# Altium footprint library 687 1xx 140 22.PcbLib: 24 footprints (part 2 of 2)
Each footprint in its own frame and in the unit in brackets; x right, y up, seen from the top. Pads: shape width x height; smd on the part's side, far side on the other; paste and mask are expansions set on the pad; w line width, h text height; cw(c..) or ccw(c..) is an arc to the next point about the centre after c.
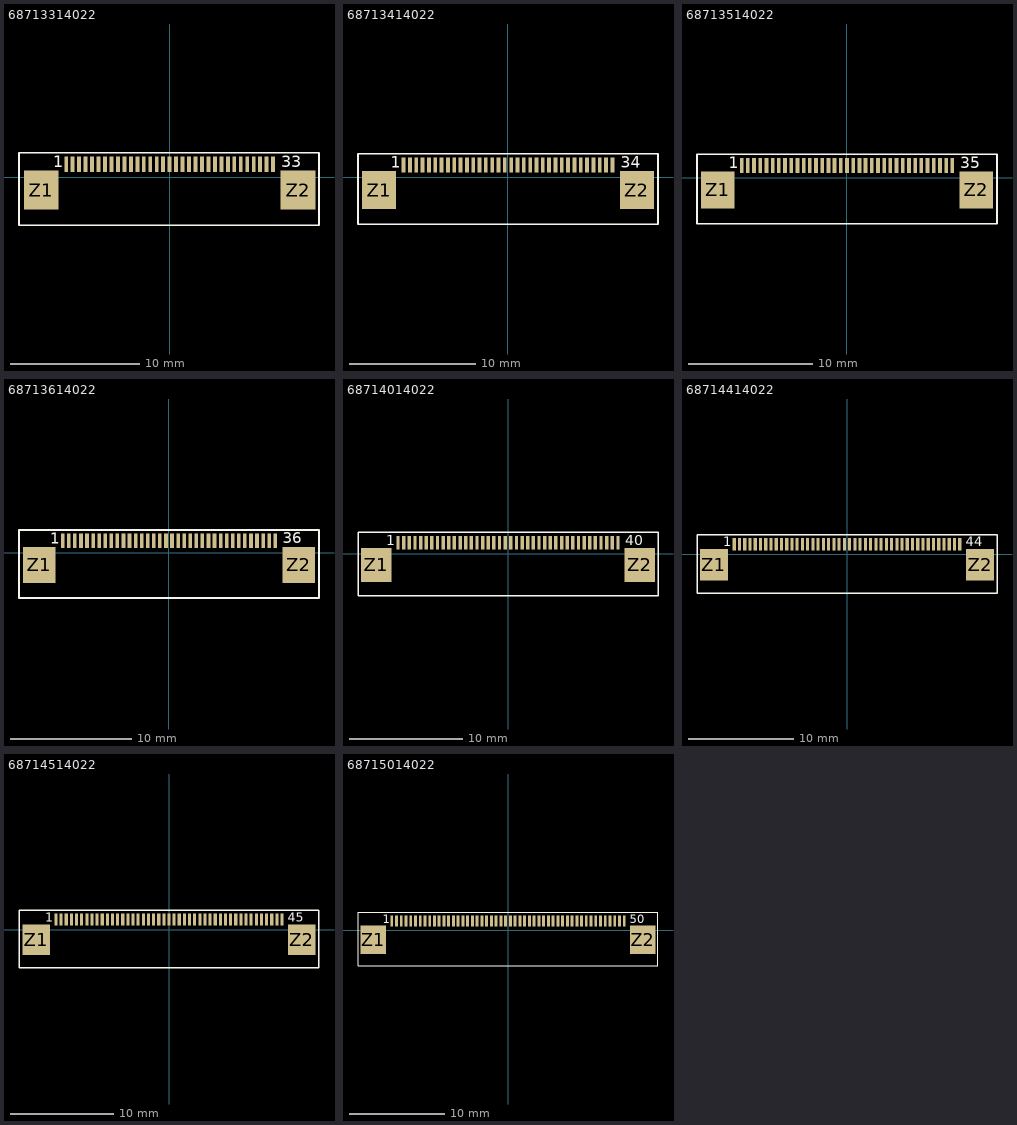
[diagram p1: the footprints below, top view; thin cyan lines are the x and y axes]

## 68713314022 [mm] "33 pins"
height 2.1
pads (35):
  rect 0.3x1.2 smd: 1(-8,0.99) 2(-7.5,0.99) 3(-7,0.99) 4(-6.5,0.99) 5(-6,0.99) 6(-5.5,0.99) 7(-5,0.99) 8(-4.5,0.99) 9(-4,0.99) 10(-3.5,0.99) 11(-3,0.99) 12(-2.5,0.99) 13(-2,0.99) 14(-1.5,0.99) 15(-1,0.99) 16(-0.5,0.99) 17(0,0.99) 18(0.5,0.99) 19(1,0.99) 20(1.5,0.99) 21(2,0.99) 22(2.5,0.99) 23(3,0.99) 24(3.5,0.99) 25(4,0.99) 26(4.5,0.99) 27(5,0.99) 28(5.5,0.99) 29(6,0.99) 30(6.5,0.99) 31(7,0.99) 32(7.5,0.99) 33(8,0.99)
  rect 2.7x3 smd: Z1(-9.93,-0.99) Z2(9.93,-0.99)
Top Overlay:
  lines w0.127: -11.65,-3.71 11.55,-3.71 11.55,1.89 -11.65,1.89 -11.65,-3.71
  text "1" at -9.013,0.771 h0.9
  text "33" at 8.64,0.771 h0.9
3D body: height 2.06, standoff -0.04, extent -11.45,-3.71 11.45,1.39

## 68713414022 [mm] "34 pins"
height 2.1
pads (36):
  rect 0.3x1.2 smd: 1(-8.25,0.99) 2(-7.75,0.99) 3(-7.25,0.99) 4(-6.75,0.99) 5(-6.25,0.99) 6(-5.75,0.99) 7(-5.25,0.99) 8(-4.75,0.99) 9(-4.25,0.99) 10(-3.75,0.99) 11(-3.25,0.99) 12(-2.75,0.99) 13(-2.25,0.99) 14(-1.75,0.99) 15(-1.25,0.99) 16(-0.75,0.99) 17(-0.25,0.99) 18(0.25,0.99) 19(0.75,0.99) 20(1.25,0.99) 21(1.75,0.99) 22(2.25,0.99) 23(2.75,0.99) 24(3.25,0.99) 25(3.75,0.99) 26(4.25,0.99) 27(4.75,0.99) 28(5.25,0.99) 29(5.75,0.99) 30(6.25,0.99) 31(6.75,0.99) 32(7.25,0.99) 33(7.75,0.99) 34(8.25,0.99)
  rect 2.7x3 smd: Z1(-10.18,-0.99) Z2(10.18,-0.99)
Top Overlay:
  lines w0.127: -11.85,-3.71 11.85,-3.71 11.85,1.89 -11.85,1.89 -11.85,-3.71
  text "1" at -9.271,0.771 h0.9
  text "34" at 8.89,0.771 h0.9
3D body: height 2.06, standoff -0.04, extent -11.7,-3.71 11.7,1.39

## 68713514022 [mm] "35 pins"
height 2.1
pads (37):
  rect 0.3x1.2 smd: 1(-8.5,0.99) 2(-8,0.99) 3(-7.5,0.99) 4(-7,0.99) 5(-6.5,0.99) 6(-6,0.99) 7(-5.5,0.99) 8(-5,0.99) 9(-4.5,0.99) 10(-4,0.99) 11(-3.5,0.99) 12(-3,0.99) 13(-2.5,0.99) 14(-2,0.99) 15(-1.5,0.99) 16(-1,0.99) 17(-0.5,0.99) 18(0,0.99) 19(0.5,0.99) 20(1,0.99) 21(1.5,0.99) 22(2,0.99) 23(2.5,0.99) 24(3,0.99) 25(3.5,0.99) 26(4,0.99) 27(4.5,0.99) 28(5,0.99) 29(5.5,0.99) 30(6,0.99) 31(6.5,0.99) 32(7,0.99) 33(7.5,0.99) 34(8,0.99) 35(8.5,0.99)
  rect 2.7x3 smd: Z1(-10.43,-0.99) Z2(10.43,-0.99)
Top Overlay:
  lines w0.127: -12.1,-3.71 12.1,-3.71 12.1,1.89 -12.1,1.89 -12.1,-3.71
  text "1" at -9.521,0.771 h0.9
  text "35" at 9.148,0.771 h0.9
3D body: height 2.06, standoff -0.04, extent -11.95,-3.71 11.95,1.39

## 68713614022 [mm] "36 pins"
height 2.1
pads (38):
  rect 0.3x1.2 smd: 1(-8.75,0.99) 2(-8.25,0.99) 3(-7.75,0.99) 4(-7.25,0.99) 5(-6.75,0.99) 6(-6.25,0.99) 7(-5.75,0.99) 8(-5.25,0.99) 9(-4.75,0.99) 10(-4.25,0.99) 11(-3.75,0.99) 12(-3.25,0.99) 13(-2.75,0.99) 14(-2.25,0.99) 15(-1.75,0.99) 16(-1.25,0.99) 17(-0.75,0.99) 18(-0.25,0.99) 19(0.25,0.99) 20(0.75,0.99) 21(1.25,0.99) 22(1.75,0.99) 23(2.25,0.99) 24(2.75,0.99) 25(3.25,0.99) 26(3.75,0.99) 27(4.25,0.99) 28(4.75,0.99) 29(5.25,0.99) 30(5.75,0.99) 31(6.25,0.99) 32(6.75,0.99) 33(7.25,0.99) 34(7.75,0.99) 35(8.25,0.99) 36(8.75,0.99)
  rect 2.7x3 smd: Z1(-10.68,-0.99) Z2(10.68,-0.99)
Top Overlay:
  lines w0.127: -12.35,-3.71 12.35,-3.71 12.35,1.89 -12.35,1.89 -12.35,-3.71
  text "1" at -9.771,0.771 h0.9
  text "36" at 9.35,0.8 h0.9
3D body: height 2.06, standoff -0.04, extent -12.2,-3.71 12.2,1.39

## 68714014022 [mm] "40 pins"
height 2.1
pads (42):
  rect 0.3x1.2 smd: 1(-9.75,0.99) 2(-9.25,0.99) 3(-8.75,0.99) 4(-8.25,0.99) 5(-7.75,0.99) 6(-7.25,0.99) 7(-6.75,0.99) 8(-6.25,0.99) 9(-5.75,0.99) 10(-5.25,0.99) 11(-4.75,0.99) 12(-4.25,0.99) 13(-3.75,0.99) 14(-3.25,0.99) 15(-2.75,0.99) 16(-2.25,0.99) 17(-1.75,0.99) 18(-1.25,0.99) 19(-0.75,0.99) 20(-0.25,0.99) 21(0.25,0.99) 22(0.75,0.99) 23(1.25,0.99) 24(1.75,0.99) 25(2.25,0.99) 26(2.75,0.99) 27(3.25,0.99) 28(3.75,0.99) 29(4.25,0.99) 30(4.75,0.99) 31(5.25,0.99) 32(5.75,0.99) 33(6.25,0.99) 34(6.75,0.99) 35(7.25,0.99) 36(7.75,0.99) 37(8.25,0.99) 38(8.75,0.99) 39(9.25,0.99) 40(9.75,0.99)
  rect 2.7x3 smd: Z1(-11.68,-0.99) Z2(11.68,-0.99)
Top Overlay:
  lines w0.127: -13.3,-3.71 -13.3,1.89 13.3,1.89 13.3,-3.71 -13.3,-3.71
  text "40" at 10.414,0.771 h0.9
  text "1" at -10.795,0.771 h0.9
3D body: height 2.06, standoff -0.04, extent -13.2,-3.71 13.2,1.39

## 68714414022 [mm] "44 pins"
height 2.1
pads (46):
  rect 0.3x1.2 smd: 1(-10.75,0.99) 2(-10.25,0.99) 3(-9.75,0.99) 4(-9.25,0.99) 5(-8.75,0.99) 6(-8.25,0.99) 7(-7.75,0.99) 8(-7.25,0.99) 9(-6.75,0.99) 10(-6.25,0.99) 11(-5.75,0.99) 12(-5.25,0.99) 13(-4.75,0.99) 14(-4.25,0.99) 15(-3.75,0.99) 16(-3.25,0.99) 17(-2.75,0.99) 18(-2.25,0.99) 19(-1.75,0.99) 20(-1.25,0.99) 21(-0.75,0.99) 22(-0.25,0.99) 23(0.25,0.99) 24(0.75,0.99) 25(1.25,0.99) 26(1.75,0.99) 27(2.25,0.99) 28(2.75,0.99) 29(3.25,0.99) 30(3.75,0.99) 31(4.25,0.99) 32(4.75,0.99) 33(5.25,0.99) 34(5.75,0.99) 35(6.25,0.99) 36(6.75,0.99) 37(7.25,0.99) 38(7.75,0.99) 39(8.25,0.99) 40(8.75,0.99) 41(9.25,0.99) 42(9.75,0.99) 43(10.25,0.99) 44(10.75,0.99)
  rect 2.7x3 smd: Z1(-12.68,-0.99) Z2(12.68,-0.99)
Top Overlay:
  lines w0.127: -14.3,-3.71 14.3,-3.71 14.3,1.89 -14.3,1.89 -14.3,-3.71
  text "1" at -11.811,0.771 h0.9
  text "44" at 11.303,0.771 h0.9
3D body: height 2.06, standoff -0.04, extent -14.2,-3.71 14.2,1.39

## 68714514022 [mm] "45 pins"
height 2.1
pads (47):
  rect 0.3x1.2 smd: 1(-11,0.99) 2(-10.5,0.99) 3(-10,0.99) 4(-9.5,0.99) 5(-9,0.99) 6(-8.5,0.99) 7(-8,0.99) 8(-7.5,0.99) 9(-7,0.99) 10(-6.5,0.99) 11(-6,0.99) 12(-5.5,0.99) 13(-5,0.99) 14(-4.5,0.99) 15(-4,0.99) 16(-3.5,0.99) 17(-3,0.99) 18(-2.5,0.99) 19(-2,0.99) 20(-1.5,0.99) 21(-1,0.99) 22(-0.5,0.99) 23(0,0.99) 24(0.5,0.99) 25(1,0.99) 26(1.5,0.99) 27(2,0.99) 28(2.5,0.99) 29(3,0.99) 30(3.5,0.99) 31(4,0.99) 32(4.5,0.99) 33(5,0.99) 34(5.5,0.99) 35(6,0.99) 36(6.5,0.99) 37(7,0.99) 38(7.5,0.99) 39(8,0.99) 40(8.5,0.99) 41(9,0.99) 42(9.5,0.99) 43(10,0.99) 44(10.5,0.99) 45(11,0.99)
  rect 2.7x3 smd: Z1(-12.93,-0.99) Z2(12.93,-0.99)
Top Overlay:
  lines w0.127: -14.6,-3.71 14.6,-3.71 14.6,1.89 -14.6,1.89 -14.6,-3.71
  text "1" at -12.061,0.771 h0.9
  text "45" at 11.561,0.771 h0.9
3D body: height 2.06, standoff -0.04, extent -14.45,-3.71 14.45,1.39

## 68715014022 [mm] "50 pins"
height 2.1
pads (52):
  rect 0.3x1.2 smd: 1(-12.25,0.99) 2(-11.75,0.99) 3(-11.25,0.99) 4(-10.75,0.99) 5(-10.25,0.99) 6(-9.75,0.99) 7(-9.25,0.99) 8(-8.75,0.99) 9(-8.25,0.99) 10(-7.75,0.99) 11(-7.25,0.99) 12(-6.75,0.99) 13(-6.25,0.99) 14(-5.75,0.99) 15(-5.25,0.99) 16(-4.75,0.99) 17(-4.25,0.99) 18(-3.75,0.99) 19(-3.25,0.99) 20(-2.75,0.99) 21(-2.25,0.99) 22(-1.75,0.99) 23(-1.25,0.99) 24(-0.75,0.99) 25(-0.25,0.99) 26(0.25,0.99) 27(0.75,0.99) 28(1.25,0.99) 29(1.75,0.99) 30(2.25,0.99) 31(2.75,0.99) 32(3.25,0.99) 33(3.75,0.99) 34(4.25,0.99) 35(4.75,0.99) 36(5.25,0.99) 37(5.75,0.99) 38(6.25,0.99) 39(6.75,0.99) 40(7.25,0.99) 41(7.75,0.99) 42(8.25,0.99) 43(8.75,0.99) 44(9.25,0.99) 45(9.75,0.99) 46(10.25,0.99) 47(10.75,0.99) 48(11.25,0.99) 49(11.75,0.99) 50(12.25,0.99)
  rect 2.7x3 smd: Z1(-14.18,-0.99) Z2(14.18,-0.99)
Top Overlay:
  lines w0.127: -15.8,-3.71 -15.8,1.89 15.8,1.89 15.8,-3.71 -15.8,-3.71
  text "1" at -13.208,0.771 h0.9
  text "50" at 12.827,0.771 h0.9
3D body: height 2.06, standoff -0.04, extent -15.7,-3.71 15.7,1.39